# Altium footprint library 7Robot.PcbLib: 67 footprints (part 1 of 5)
Each footprint in its own frame and in the unit in brackets; x right, y up, seen from the top. Pads: shape width x height; smd on the part's side, far side on the other; paste and mask are expansions set on the pad; w line width, h text height; cw(c..) or ccw(c..) is an arc to the next point about the centre after c.
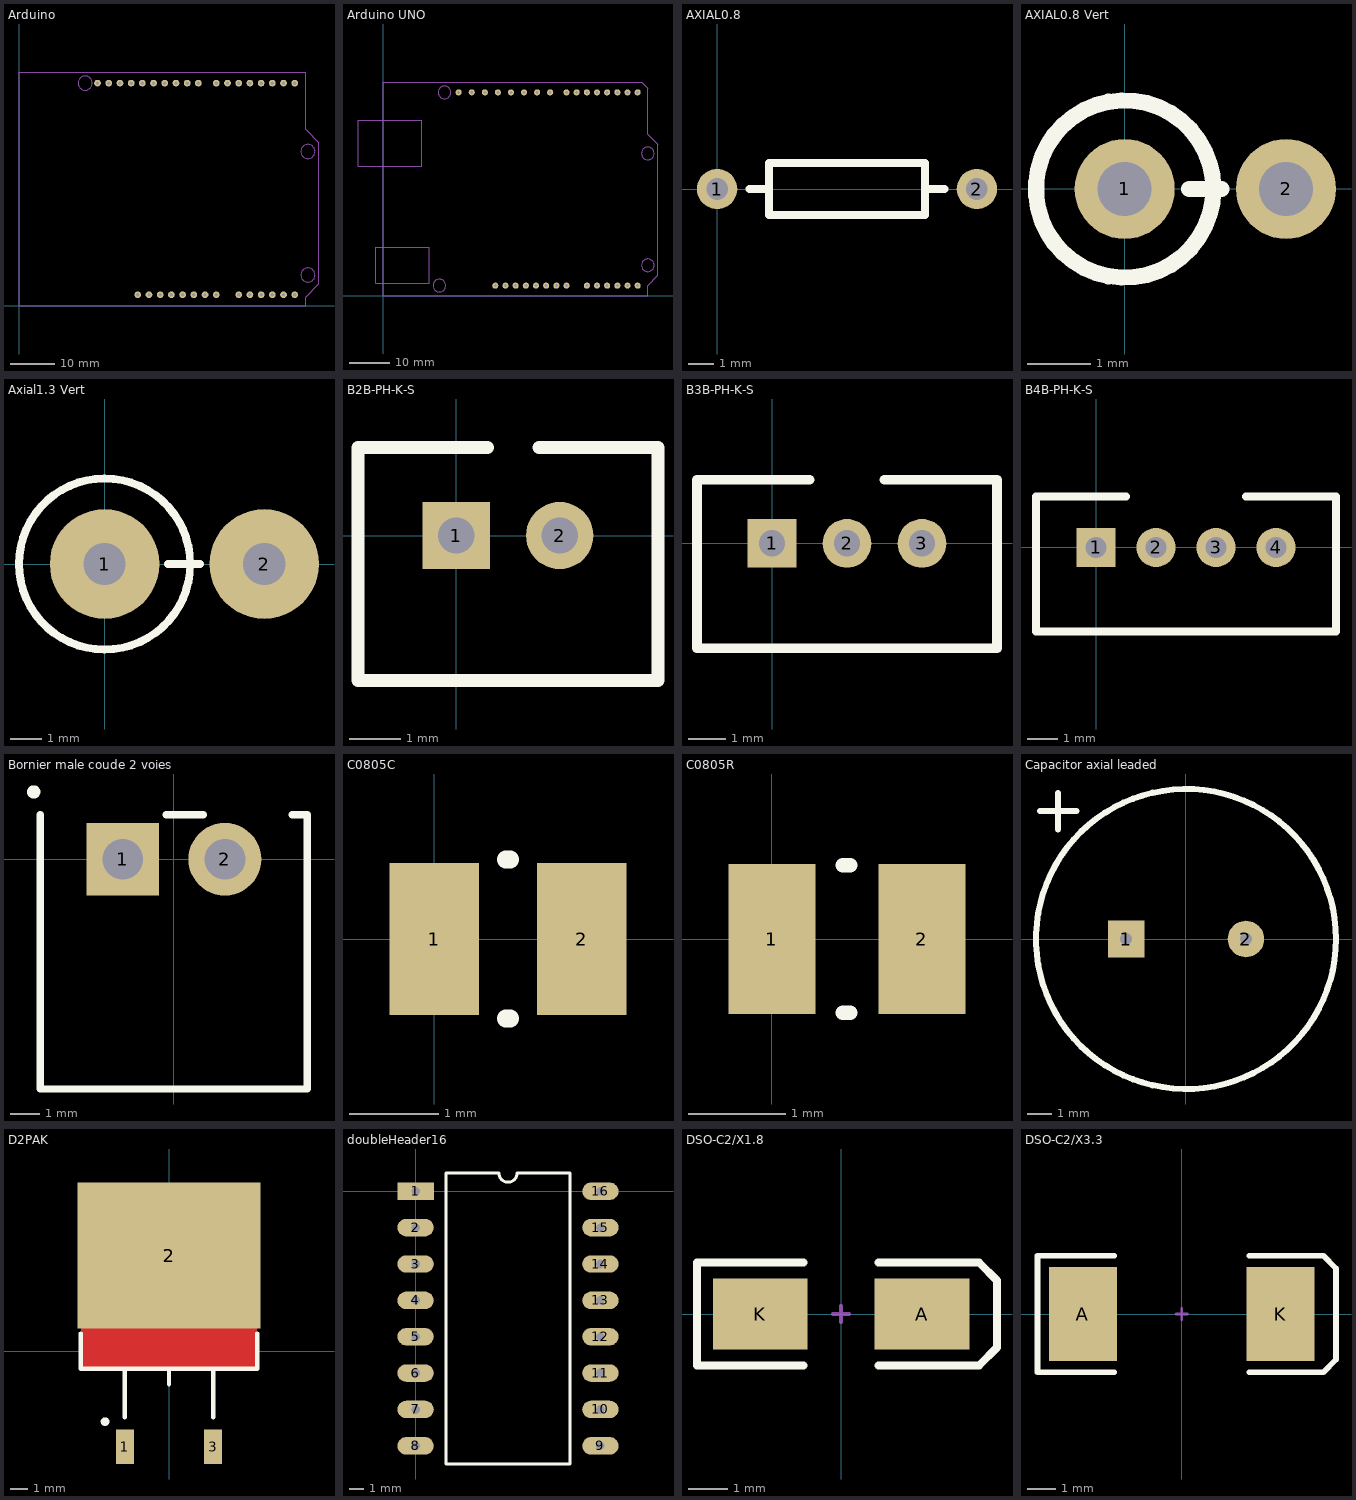
[diagram p0: the footprints below, top view; thin cyan lines are the x and y axes]

## Arduino [mil]
pads (32):
  round 60 hole 30: 1(2460.63,1988.19) 2(2360.63,1988.19) 3(2260.63,1988.19) 4(2160.63,1988.19) 5(2060.63,1988.19) 6(1960.63,1988.19) 7(1860.63,1988.19) 8(1760.63,1988.19) 9(1600.63,1988.19) 10(1500.63,1988.19) 11(1400.63,1988.19) 12(1300.63,1988.19) 13(1200.63,1988.19) 14(1100.63,1988.19) 15(1000.63,1988.19) 16(900.63,1988.19) 17(800.63,1988.19) 18(700.63,1988.19) 19(2460.63,100) 20(2360.63,100) 21(2260.63,100) 22(2160.63,100) 23(2060.63,100) 24(1960.63,100) 25(1760,100) 26(1660,100) 27(1560,100) 28(1460,100) 29(1360,100) 30(1260,100) 31(1160,100) 32(1060,100)
Mechanical 1:
  circle w10: c2578.74,1377.95 r62.99
  circle w10: c2578.74,275.59 r62.99
  circle w10: c590.55,1988.19 r62.99
  lines w10: 2677.17,196.85 2677.17,1456.69 ; 2677.17,196.85 2677.17,196.85 ; 2677.17,196.85 2559.06,78.74 2559.06,0 0,0 0,2086.61 2559.06,2086.61 2559.06,1574.8 2677.17,1456.69 ; 2677.17,1456.69 2677.17,1456.69

## Arduino UNO [mil]
pads (30):
  round 60 hole 30: 1(2500,2000) 2(2400,2000) 3(2300,2000) 4(2200,2000) 5(2100,2000) 6(2000,2000) 7(1900,2000) 8(1800,2000) 9(1640,2000) 10(1511.43,2000) 11(1382.86,2000) 12(1254.29,2000) 13(1125.71,2000) 14(997.14,2000) 15(868.57,2000) 16(740,2000) 17(2500,100) 18(2400,100) 19(2300,100) 20(2200,100) 21(2100,100) 22(2000,100) 23(1800,100) 24(1700,100) 25(1600,100) 26(1500,100) 27(1400,100) 28(1300,100) 29(1200,100) 30(1100,100)
Mechanical 1:
  circle w10: c2600,300 r62.5
  circle w10: c2600,1400 r62.5
  circle w10: c550,100 r62.5
  circle w10: c600,2000 r62.5
  lines w10: -250,1275 -250,1725 375,1725 375,1275 -250,1275 ; -75,125 450,125 450,475 -75,475 -75,125 ; 0,0 2600,0 2600,100 2700,200 2700,1490 2600,1590 2600,2040 2540,2100 0,2100 0,0

## AXIAL0.8 [mil] "Resistor 1/4W"
height 196.85
pads (2):
  round 62 hole 33.46: 1(0,0) 2(400,0)
Top Overlay:
  lines w12: 50,0 80,0 ; 320,0 350,0 ; 80,-40 320,-40 320,40 80,40 80,-40
3D body: height 115.5, standoff -100, extent -11.99,-45.49 412.01,45.51

## AXIAL0.8 Vert [mil] "Resistor 1/4W vertical"
height 196.85
pads (2):
  round 62 hole 33.46: 1(0,0) 2(100,0)
Top Overlay:
  circle w10: c0,0 r55
  lines w10: 40,0 59.99,0
3D body: height 435.04, standoff -157.48, extent -70.08,-70.08 116.93,70.08

## Axial1.3 Vert [mm] "Vertical Axial Lead ; Diode : DO-201AD ; 5mm radius, 1.25mm leads"
height 15
pads (2):
  round 3.5 hole 1.35: 1(0,0) 2(5.1,0)
Top Overlay:
  circle w0.254: c0,0 r2.736
  lines w0.254: 2.032,0 3.048,0
3D body: height 15.69, standoff -3, extent -2.8,-2.8 5.74,2.8

## B2B-PH-K-S [mm] "JST Header 2 pins Straight"
pads (2):
  rect 1.3x1.3 hole 0.7: 1(0,0)
  round 1.3 hole 0.7: 2(2,0)
Top Overlay:
  lines w0.254: 0.6,1.7 -1.9,1.7 -1.9,-2.8 3.9,-2.8 3.9,1.7 1.6,1.7
3D body: height 6, standoff -3.4, extent -1.95,-2.8 3.95,1.7

## B3B-PH-K-S [mm] "JST Header 3 pins Straight"
height 6
pads (3):
  rect 1.3x1.3 hole 0.7: 1(0,0)
  round 1.3 hole 0.7: 2(2,0) 3(4,0)
Top Overlay:
  lines w0.254: 1,1.7 -2,1.7 -2,-2.8 6,-2.8 6,1.7 3,1.7
3D body: height 6, standoff -3.4, extent -1.95,-2.8 5.95,1.7

## B4B-PH-K-S [mm] "JST Header 4 pins Straight"
height 6
pads (4):
  rect 1.3x1.3 hole 0.7: 1(0,0)
  round 1.3 hole 0.7: 2(2,0) 3(4,0) 4(6,0)
Top Overlay:
  lines w0.254: 1,1.7 -2,1.7 -2,-2.8 8,-2.8 8,1.7 5,1.7
3D body: height 6, standoff -3.4, extent -1.95,-2.8 7.95,1.7

## Bornier male coude 2 voies [mm] "Bornier male coude 2 voies 12A. Pas 5mm (model : CTB9350/2A) -- 3D FAUSSE"
pads (2):
  rect 2.5x2.5 hole 1.4: 1(-1.75,0)
  round 2.5 hole 1.4: 2(1.75,0)
Top Overlay:
  circle w0.254: c-4.802,2.308 r0.1
  lines w0.254: -4.572,1.524 -4.572,-7.874 4.572,-7.874 4.572,1.524 4.064,1.524 ; -0.254,1.524 1.016,1.524
3D body: height 7.25, standoff -3.4, extent -4.2,-7.93 4.2,1.27

## C0805C [mm]
height 1
pads (2):
  rect 1x1.7 smd: 1(0,0) 2(1.65,0)
Top Overlay:
  lines w0.2: 0.8,-0.889 0.85,-0.889 ; 0.8,0.889 0.85,0.889
3D body: height 0.78, standoff 0, extent -0.213,-0.61 1.787,0.64

## C0805R [mm]
height 1
pads (2):
  rect 0.9x1.55 smd: 1(0,0) 2(1.55,0)
Top Overlay:
  lines w0.15: 0.73,-0.762 0.81,-0.762 ; 0.73,0.762 0.81,0.762
3D body: height 0.78, standoff 0, extent -0.238,-0.625 1.762,0.625

## Capacitor axial leaded [mm] "height x diam 20mm x 12.5mm"
height 20
pads (2):
  rect 1.524x1.524 hole 0.5: 1(-2.5,0)
  round 1.524 hole 0.5: 2(2.5,0)
Top Overlay:
  circle w0.254: c0,0 r6.257
  lines w0.254: -6.096,5.334 -4.572,5.334 ; -5.334,4.572 -5.334,6.096
3D body: height 20.01, standoff -2.7, extent -6.25,-6.25 6.206,6.25

## D2PAK [mm] "Power SMT D2-PAK/TO-263-AB; 3 Leads (1 Cropped); Body 15.5 (inc. leads) x 10.5 mm (LxW max)"
height 4.69
pads (3):
  rect 1.05x2 smd: 1(-2.54,-5.5) 3(2.54,-5.5)
  rect 10.55x8.4 smd: 2(0,5.5)
Top Layer:
  rectangle: -5.08,-1.016 5.08,1.524
Top Overlay:
  circle w0.25: c-3.681,-4.064 r0.125
  lines w0.254: -5.08,1.016 -5.08,-1.016 5.08,-1.016 5.08,1.016 ; -2.54,-3.81 -2.54,-1.016 ; 0,-1.905 0,-1.016 ; 2.54,-3.81 2.54,-1.016
3D body: height 4.78, standoff -0.23, extent -5.08,-5.86 5.08,9.404

## doubleHeader16 [mm]
pads (16):
  rect 2.5x1.2 hole 0.6: 1(0,0)
  oval 2.5x1.2 hole 0.6: 2(0,-2.5) 3(0,-5) 4(0,-7.5) 5(0,-10) 6(0,-12.5) 7(0,-15) 8(0,-17.5) 9(12.7,-17.5) 10(12.7,-15) 11(12.7,-12.5) 12(12.7,-10) 13(12.7,-7.5) 14(12.7,-5) 15(12.7,-2.5) 16(12.7,0)
Top Overlay:
  lines w0.2: 2.085,-18.75 2.085,1.25 5.725,1.25 ccw(c6.35,1.25) 6.975,1.25 10.615,1.25 10.615,-18.75 2.085,-18.75

## DSO-C2/X1.8 [mm] "Diode; DO-214-AC/SMA; 2 C-Bend Leads; Body 5 x 2.7 mm, inc. leads (LxW)"
height 2.44
pads (2):
  rect 2.4x1.8 smd: A(2.05,0) K(-2.05,0)
Top Overlay:
  lines w0.2: -0.95,-1.3 -3.65,-1.3 -3.65,1.3 -0.95,1.3 ; 0.95,-1.3 3.5,-1.3 3.95,-0.85 3.95,0.85 3.5,1.3 0.95,1.3
Mechanical 1:
  lines w0.1: -0.2,0 0.2,0 ; 0,-0.2 0,0.2
3D body: height 2.28, standoff 0, extent -2.743,-1.397 2.743,1.397

## DSO-C2/X3.3 [mm] "DO-214-AB/SMC; 2 C-Bend Leads; Body 7.9 x 5.9 mm, inc. leads (LxW)"
height 2.57
pads (2):
  rect 2.4x3.3 smd: A(-3.475,0) K(3.475,0)
Top Overlay:
  lines w0.2: -2.375,-2.05 -5.075,-2.05 -5.075,2.05 -2.375,2.05 ; 2.375,-2.05 4.975,-2.05 5.425,-1.6 5.425,1.6 4.975,2.055 ; 2.375,2.05 4.975,2.05
Mechanical 1:
  lines w0.1: -0.2,0 0.2,0 ; 0,-0.2 0,0.2
3D body: height 2.67, standoff 0.03, extent -4.064,-3.15 4.064,3.15